# Altium footprint library laihi.PcbLib: 222 footprints (part 14 of 14)
Each footprint in its own frame and in the unit in brackets; x right, y up, seen from the top. Pads: shape width x height; smd on the part's side, far side on the other; paste and mask are expansions set on the pad; w line width, h text height; cw(c..) or ccw(c..) is an arc to the next point about the centre after c.
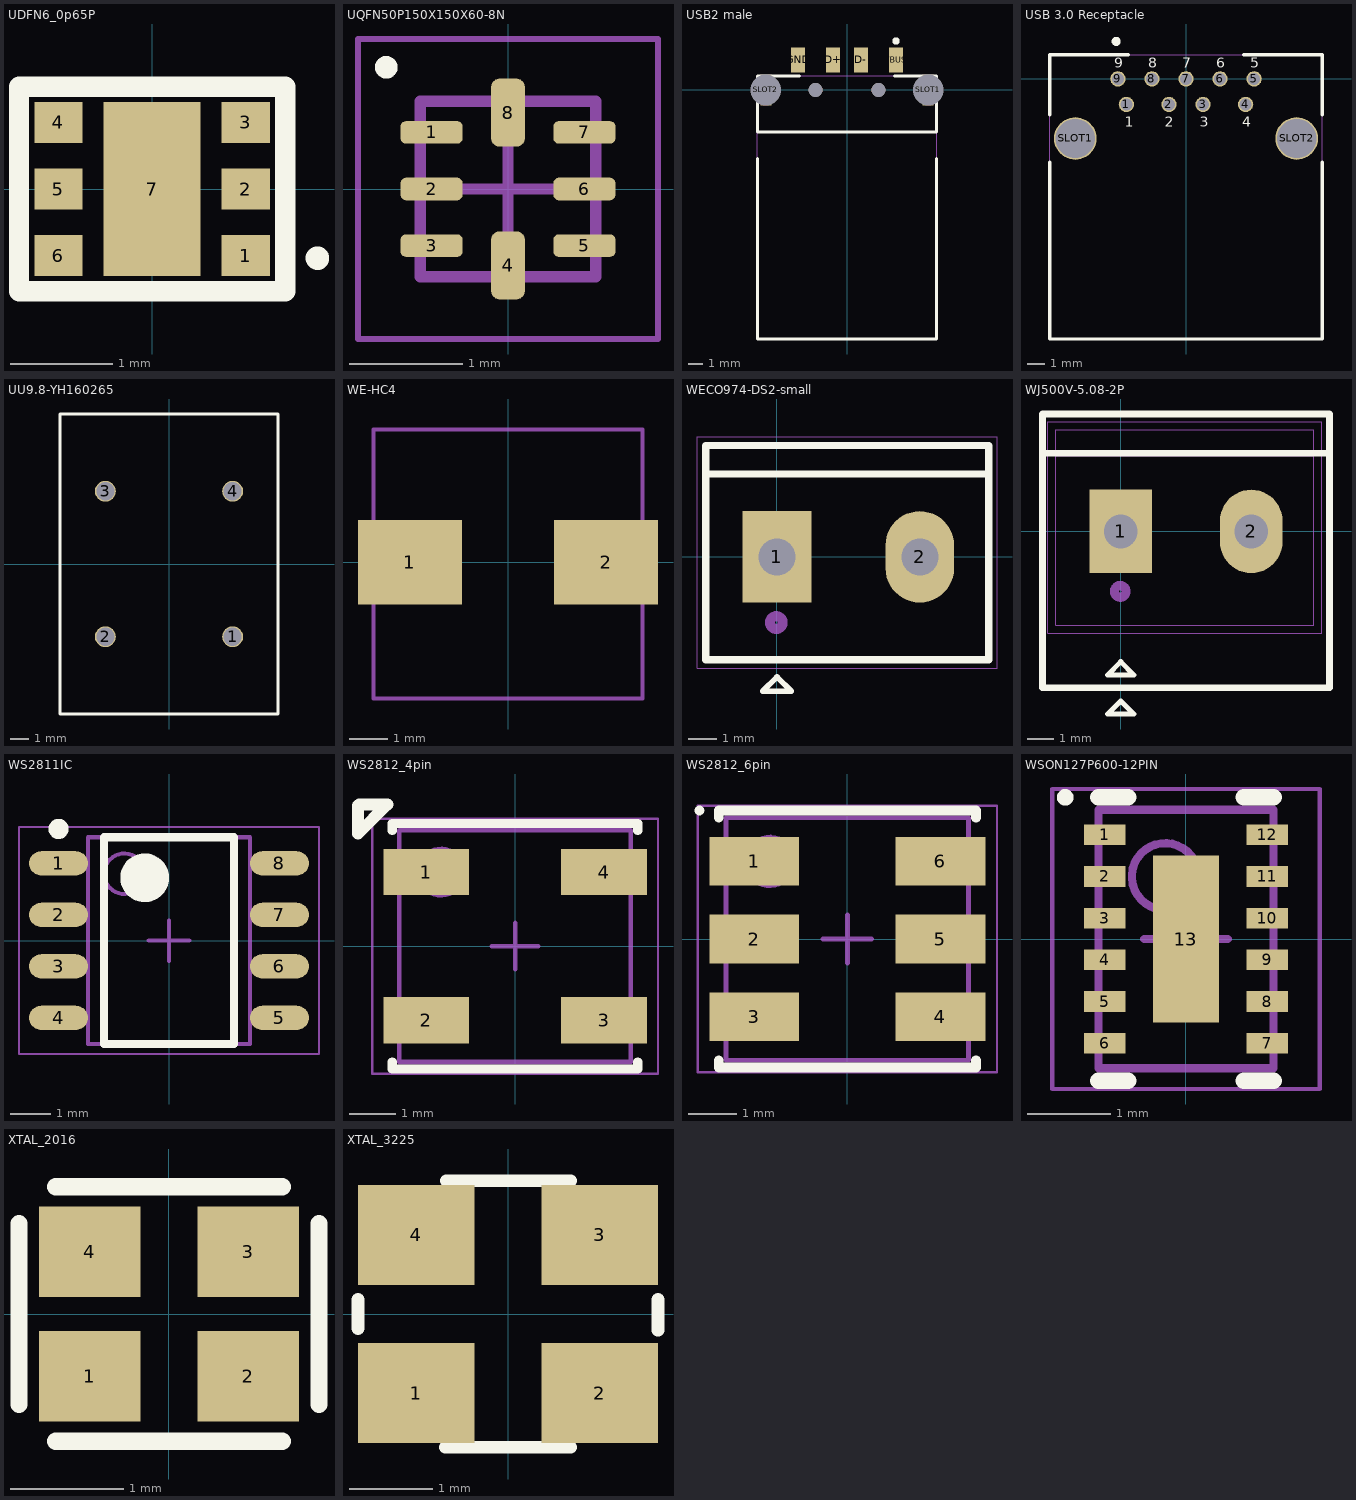
[diagram p13: the footprints below, top view; thin cyan lines are the x and y axes]

## UDFN6_0p65P [mm] "UDFN6 2x2 PITCH 0.65"
height 0.5
pads (7):
  rect 0.47x0.4 smd mask+0.051: 1(0.915,-0.65) 2(0.915,0) 3(0.915,0.65) 4(-0.915,0.65) 5(-0.915,0) 6(-0.915,-0.65)
  rect 0.95x1.7 smd mask+0.051: 7(0,0)
Top Overlay:
  circle w0.2: c1.615,-0.675 r0.015
  lines w0.2: -1.3,-1 1.3,-1 1.3,1 -1.3,1 -1.3,-1
Mechanical 15:
  lines w0.1: -1.3,-1 -1.3,1 1.3,1 1.3,-1 -1.3,-1
3D body: height 0.6, standoff 0, extent -1,-1 1,1

## UQFN50P150X150X60-8N [mm] "QFN, 8-Leads, Body 1.50x1.50mm, Pitch 0.50mm, IPC Medium Density"
height 0.6
pads (8):
  rrect50% 0.55x0.2 smd mask+0.07: 1(-0.675,0.5) 2(-0.675,0) 3(-0.675,-0.5) 5(0.675,-0.5) 6(0.675,0) 7(0.675,0.5)
  rrect50% 0.3x0.6 smd mask+0.07: 4(0,-0.675) 8(0,0.675)
Top Overlay:
  circle w0.1: c-1.075,1.075 r0.05
Mechanical 13:
  lines w0.1: -0.775,-0.775 -0.775,0.775 0.775,0.775 0.775,-0.775 -0.775,-0.775
Mechanical 15:
  lines w0.05: -1.325,-1.325 -1.325,1.325 1.325,1.325 1.325,-1.325 -1.325,-1.325
  lines w0.1: -0.5,0 0.5,0 ; 0,-0.5 0,0.5
3D body "UQFN50P150X150X60-8N.step": height 0.6, standoff 0, extent -0.825,-0.825 0.825,0.825

## USB2 male [mm] "USB 2 standard male connector"
height 2
pads (8):
  rect 1x1.8 smd: D+(-1,2.15) D-(1,2.15) GND(-3.5,2.15) VBUS(3.5,2.15)
  rect 0.8x2.2 hole 2.2 square unplated: SLOT1(5.8,0) SLOT2(-5.8,0)
  round 1 hole 1: ""(-2.25,0) ""(2.25,0)
Top Overlay:
  circle w0.25: c3.5,3.5 r0.141
  lines w0.2: -6.4,-4.9 -6.4,-17.8 6.4,-17.8 6.4,-4.9 ; -3.4,1 -6.4,1 -6.4,-3 6.4,-3 6.4,1 3.4,1
Mechanical 13:
  lines w0.025: -6.4,-17.8 -6.4,1 6.4,1 6.4,-17.8 -6.4,-17.8

## USB 3.0 Receptacle [mm] "USB 3.0 standard receptacle"
height 8.128
pads (11):
  round 0.9 hole 0.7: 1(-3.5,-1.5) 2(-1,-1.5) 3(1,-1.5) 4(3.5,-1.5) 5(4,0) 6(2,0) 7(0,0) 8(-2,0) 9(-4,0)
  round 2.5 hole 2.3: SLOT1(-6.5,-3.5) SLOT2(6.5,-3.5)
Top Overlay:
  circle w0.25: c-4.1,2.2 r0.141
  lines w0.2: -8,-4.9 -8,-15.275 8,-15.275 8,-4.9 ; -8,-2.1 -8,1.425 -3.4,1.425 ; 3.4,1.425 8,1.425 8,-2.1
  text "4" at 3.3,-2.825 h0.6
  text "3" at 0.8,-2.825 h0.6
  text "2" at -1.25,-2.825 h0.6
  text "5" at 3.775,0.65 h0.6
  text "1" at -3.6,-2.825 h0.6
  text "6" at 1.775,0.65 h0.6
  text "7" at -0.225,0.65 h0.6
  text "8" at -2.225,0.65 h0.6
  text "9" at -4.225,0.65 h0.6
Mechanical 13:
  lines w0.025: -8,-15.275 8,-15.275 8,1.425 -8,1.425 -8,-15.275

## UU9.8-YH160265 [mm] "共模电感"
height 16.5
pads (4):
  round 1.152 hole 1: 1(3.5,-4) 2(-3.5,-4) 3(-3.5,4) 4(3.5,4)
Top Overlay:
  lines w0.15: -6,-8.25 6,-8.25 6,8.25 -6,8.25 -6,-8.25

## WE-HC4 [mm] "Inductor, Shielded Drum Core, Superflux, 1.5 μH, 11 A,  0.0078 ohm, SMD"
pads (2):
  rect 2.7x2.2 smd: 1(-2.55,0) 2(2.55,0)
Mechanical 13:
  lines w0.1: -3.5,-3.55 -3.5,3.45 3.5,3.45 3.5,-3.55 -3.5,-3.55

## WECO974-DS2-small [mm] "Weco Type DS247-DS2 Header"
height 12
pads (2):
  rect 2.4x3.2 hole 1.3: 1(0,0)
  oval 2.4x3.2 hole 1.3: 2(5,0)
Top Overlay:
  lines w0.2: -0.5,-4.7 0,-4.2 0.5,-4.7 -0.5,-4.7
  lines w0.254: -2.493,2.9 7.413,2.9 ; 7.413,2.9 7.413,3.9 -2.493,3.9 -2.493,0 -2.493,-3.6 7.413,-3.6 7.413,2.9
Mechanical 13:
  circle w0.025: c5,0 r0.6
  circle w0.025: c0,0 r0.6
  circle w0.35: c-0.024,-2.3 r0.224
  lines w0.025: 7.4,2.9 -2.5,2.9 -2.5,3.9 ; -2.5,3.9 -2.5,-3.6 7.4,-3.6 7.4,3.9 -2.5,3.9
Mechanical 15:
  lines w0.025: -2.8,-3.9 7.7,-3.9 7.7,4.2 -2.8,4.2 -2.8,-3.9
3D body: height 12, standoff 0, extent -2.5,-3.6 7.4,3.9

## WJ500V-5.08-2P [mm] "Weco Type DS247-DS2 Header"
height 14
pads (2):
  rect 2.4x3.2 hole 1.3: 1(0,0)
  oval 2.4x3.2 hole 1.3: 2(5,0)
Top Overlay:
  lines w0.2: -0.5,-7 0.5,-7 0,-6.5 -0.5,-7 ; -0.5,-5.5 0.5,-5.5 0,-5 -0.5,-5.5
  lines w0.254: -2.999,3 8,3 ; -3,-6 -3,-0.507 -3,4.5 8,4.5 8,2.313 8,-6 -3,-6
Mechanical 13:
  circle w0.025: c5,0 r0.6
  circle w0.025: c0,0 r0.6
  circle w0.35: c-0.024,-2.3 r0.224
  lines w0.025: 7.4,2.9 -2.5,2.9 -2.5,3.9 ; -2.5,3.9 -2.5,-3.6 7.4,-3.6 7.4,3.9 -2.5,3.9
Mechanical 15:
  lines w0.025: -2.8,-3.9 7.7,-3.9 7.7,4.2 -2.8,4.2 -2.8,-3.9
3D body: height 12, standoff 0, extent -3,-6 8,4.5

## WS2811IC [mm] "LED driver IC only, SOP8-Leads, Body 4.90x3.90mm, Pitch 1.27mm, IPC Medium Density"
height 1.75
pads (8):
  oval 1.45x0.6 smd: 1(-2.725,1.905) 2(-2.725,0.635) 3(-2.725,-0.635) 4(-2.725,-1.905) 5(2.725,-1.905) 6(2.725,-0.635) 7(2.725,0.635) 8(2.725,1.905)
Top Overlay:
  circle w0.25: c-2.725,2.755 r0.125
  circle w0.6: c-0.6,1.55 r0.3
  lines w0.2: -1.6,-2.55 -1.6,2.55 1.6,2.55 1.6,-2.55 -1.6,-2.55
Mechanical 13:
  circle w0.1: c-1.1,1.65 r0.5
  lines w0.1: -2,-2.55 -2,2.55 2,2.55 2,-2.55 -2,-2.55
Mechanical 15:
  lines w0.05: -3.7,-2.8 -3.7,2.8 3.7,2.8 3.7,-2.8 -3.7,-2.8
  lines w0.1: -0.5,0 0.5,0 ; 0,-0.5 0,0.5
3D body: height 1.75, standoff 0.1, extent -2,-2.55 2,2.55

## WS2812_4pin [mm] "Integrated 5050 LED RGB 256 levels with IC, SON, 4-Leads, Body 5.00x5.00mm, Pitch 1.60mm, IPC Medium Density"
height 2.65
pads (4):
  rect 1.85x1 smd: 1(-1.92,1.6) 2(-1.92,-1.6) 3(1.92,-1.6) 4(1.92,1.6)
Top Overlay:
  lines w0.2: -2.65,-2.5 -2.65,-2.65 2.65,-2.65 2.65,-2.5 ; -2.65,2.5 -2.65,2.65 2.65,2.65 2.65,2.5
  lines w0.254: -3.391,3.035 -3.391,2.426 -2.756,3.061 -3.365,3.061
Mechanical 13:
  circle w0.1: c-1.6,1.6 r0.5
  lines w0.1: -2.5,-2.5 2.5,-2.5 2.5,2.5 -2.5,2.5 -2.5,-2.5
Mechanical 15:
  lines w0.05: -3.085,-2.75 3.085,-2.75 3.085,2.75 -3.085,2.75 -3.085,-2.75
  lines w0.1: -0.5,0 0.5,0 ; 0,-0.5 0,0.5
3D body: height 2.65, standoff 0.1, extent -2.5,-2.5 2.5,2.5

## WS2812_6pin [mm] "Integrated 5050 LED RGB 256 levels with IC, SON, 6-Leads, Body 5.00x5.00mm, Pitch 1.60mm, IPC Medium Density"
height 2.65
pads (6):
  rect 1.85x1 smd: 1(-1.92,1.6) 2(-1.92,0) 3(-1.92,-1.6) 4(1.92,-1.6) 5(1.92,0) 6(1.92,1.6)
Top Overlay:
  circle w0.1: c-3.05,2.65 r0.05
  lines w0.2: -2.65,-2.5 -2.65,-2.65 2.65,-2.65 2.65,-2.5 ; -2.65,2.5 -2.65,2.65 2.65,2.65 2.65,2.5
Mechanical 13:
  circle w0.1: c-1.6,1.6 r0.5
  lines w0.1: -2.5,-2.5 -2.5,2.5 2.5,2.5 2.5,-2.5 -2.5,-2.5
Mechanical 15:
  lines w0.05: -3.085,-2.75 -3.085,2.75 3.085,2.75 3.085,-2.75 -3.085,-2.75
  lines w0.1: -0.5,0 0.5,0 ; 0,-0.5 0,0.5
3D body: height 2.65, standoff 0.1, extent -2.5,-2.5 2.5,2.5

## WSON127P600-12PIN [mm] "PowerPAD (WSON) - DSS"
height 0.8
pads (13):
  rect 0.5x0.25 smd: 1(-0.975,1.25) 2(-0.975,0.75) 3(-0.975,0.25) 4(-0.975,-0.25) 5(-0.975,-0.75) 6(-0.975,-1.25) 7(0.975,-1.25) 8(0.975,-0.75) 9(0.975,-0.25) 10(0.975,0.25) 11(0.975,0.75) 12(0.975,1.25)
  rect 0.79x2 smd: 13(0,0)
Top Overlay:
  circle w0.1: c-1.45,1.7 r0.05
  lines w0.2: -1.05,-1.7 -0.695,-1.7 ; -1.05,1.7 -0.695,1.7 ; 0.695,-1.7 1.05,-1.7 ; 0.695,1.7 1.05,1.7
Mechanical 13:
  circle w0.1: c-0.25,0.75 r0.4
  lines w0.1: -1.05,-1.55 1.05,-1.55 1.05,1.55 -1.05,1.55 -1.05,-1.55
Mechanical 15:
  lines w0.05: -1.605,-1.8 1.605,-1.8 1.605,1.8 -1.605,1.8 -1.605,-1.8
  lines w0.1: -0.5,0 0.5,0 ; 0,-0.5 0,0.5
3D body: height 0.8, standoff 0.1, extent -1.05,-1.55 1.05,1.55

## XTAL_2016 [mm]
height 0.8
pads (4):
  rect 0.9x0.8 smd: 1(-0.7,-0.55) 2(0.7,-0.55) 3(0.7,0.55) 4(-0.7,0.55)
Top Overlay:
  lines w0.152: -1.325,-0.8 -1.325,0.8 ; -1,-1.125 1,-1.125 ; -1,1.125 1,1.125 ; 1.325,-0.8 1.325,0.8
3D body "User Library-GeyerElectronics_KX6.step": height 0.56, standoff 0, extent -1.25,-1 1.27,1
3D body: height 0.56, standoff 0.15, extent -1.05,-0.8 1.05,0.8

## XTAL_3225 [mm]
height 0.8
pads (4):
  rect 1.4x1.2 smd: 1(-1.1,-0.95) 2(1.1,-0.95) 3(1.1,0.95) 4(-1.1,0.95)
Top Overlay:
  lines w0.152: -1.8,-0.175 -1.8,0.175 ; -0.75,-1.6 0.75,-1.6 ; -0.74,1.6 0.75,1.6 ; 1.8,-0.195 1.8,0.175
3D body "User Library-GeyerElectronics_KX6.step": height 0.56, standoff 0, extent -1.25,-1 1.27,1
3D body: height 0.56, standoff 0.15, extent -1.05,-0.8 1.05,0.8